# Altium footprint library Capacitor.PcbLib: 119 footprints (part 8 of 8)
Each footprint in its own frame and in the unit in brackets; x right, y up, seen from the top. Pads: shape width x height; smd on the part's side, far side on the other; paste and mask are expansions set on the pad; w line width, h text height; cw(c..) or ccw(c..) is an arc to the next point about the centre after c.
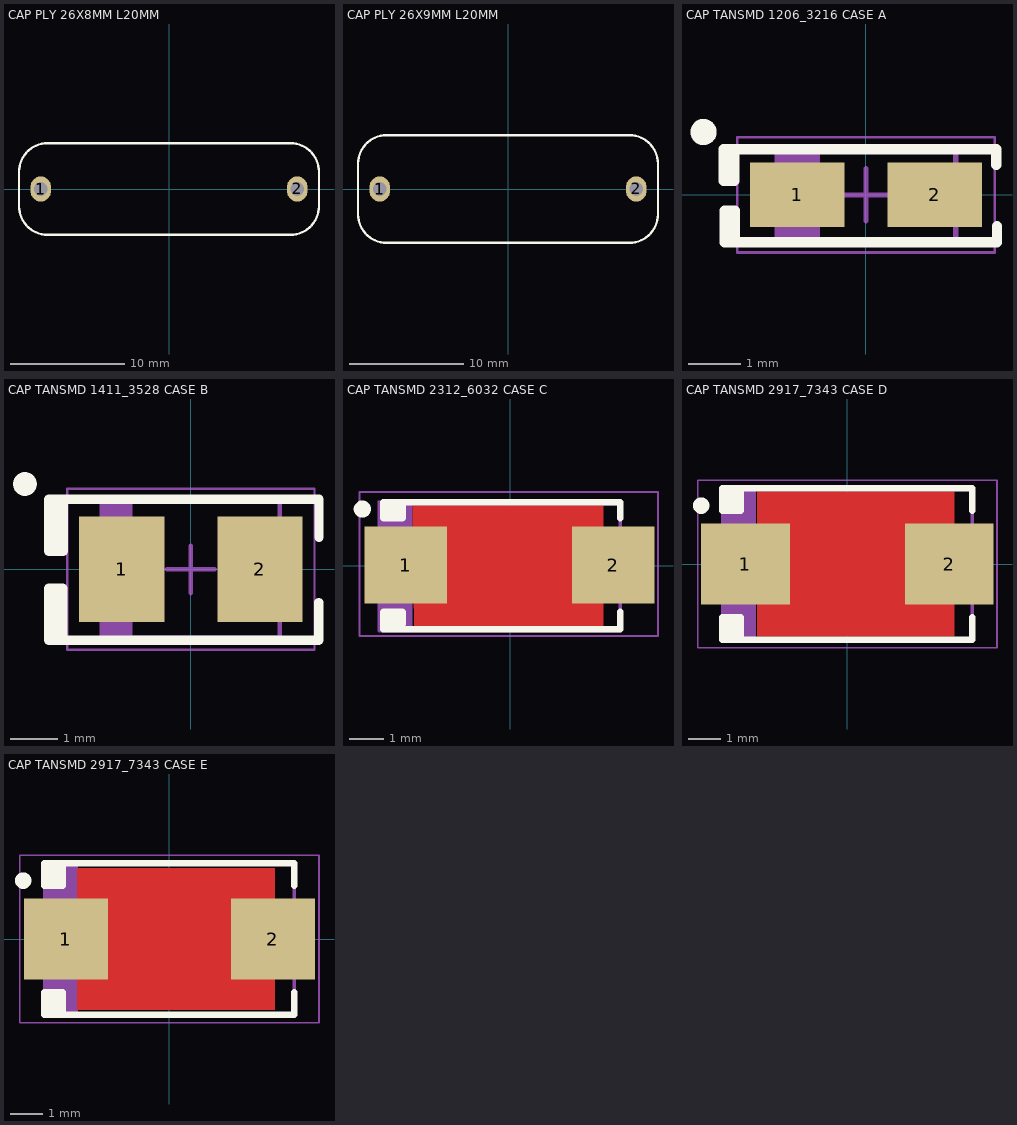
[diagram p7: the footprints below, top view; thin cyan lines are the x and y axes]

## CAP PLY 26X8MM L20MM [mm] "CAP, POLYESTER, 26.0X7.8mm pitch: 20.0mm, 0.68uF 400V"
pads (2):
  oval 1.8x2.2 hole 1.2: 1(-11.2,0) 2(11.2,0)
Top Overlay:
  lines w0.2: -13.1,-1.5 ccw(c-10.6,-1.5) -10.6,-4 10.6,-4 ccw(c10.6,-1.5) 13.1,-1.5 13.1,1.5 ccw(c10.6,1.5) 10.6,4 -10.6,4 ccw(c-10.6,1.5) -13.1,1.5 -13.1,-1.5
3D body "User Library-ECQE(F) 0_33uf 630Vdc 250Vac.step": height 19, standoff -3, extent -13,-3.9 13,3.9

## CAP PLY 26X9MM L20MM [mm] "CAP, POLYESTER, 26.0X9.3mm pitch: 20.0mm, 0.68uF 400V"
pads (2):
  oval 1.8x2.2 hole 1.2: 1(-11.2,0) 2(11.2,0)
Top Overlay:
  lines w0.2: -13.1,-2.2 ccw(c-10.6,-2.2) -10.6,-4.7 10.6,-4.7 ccw(c10.6,-2.2) 13.1,-2.2 13.1,2.2 ccw(c10.6,2.2) 10.6,4.7 -10.6,4.7 ccw(c-10.6,2.2) -13.1,2.2 -13.1,-2.2
3D body "SW3dPS-ECQE(F) 0.47uf 630Vdc 250Vac.STEP": height 3, standoff -20.5, extent -13,-4.65 13,4.65

## CAP TANSMD 1206_3216 CASE A [mm] "Molded Capacitor, 2-Leads, Body 3.20x1.6mm, Case A, IPC Medium Density"
height 1.7
pads (2):
  rect 1.8x1.23 smd: 1(-1.31,0) 2(1.31,0)
Top Overlay:
  circle w0.25: c-3.1,1.2 r0.125
  rectangle: -2.717,0.273 -2.567,0.873
  rectangle: -2.7,-0.9 -2.55,-0.3
  lines w0.2: -2.517,0.873 -2.517,0.273 -2.717,0.273 -2.717,0.873 2.483,0.873 2.483,0.573 ; -2.5,-0.9 -2.5,-0.3 -2.7,-0.3 -2.7,-0.9 2.5,-0.9 2.5,-0.6
Mechanical 13:
  rectangle: -1.715,-0.85 -0.875,0.85
  lines w0.1: -1.7,-0.85 -1.7,0.85 1.715,0.85 1.715,-0.85 -1.7,-0.85
Mechanical 15:
  lines w0.05: -2.46,-1.1 2.46,-1.1 2.46,1.1 -2.46,1.1 -2.46,-1.1
  lines w0.1: -0.5,0 0.5,0 ; 0,-0.5 0,0.5
3D body "CAP TANT - 1206 - 1.7MM.step": height 1.7, standoff 0, extent -1.715,-0.85 1.715,0.85

## CAP TANSMD 1411_3528 CASE B [mm] "Molded Capacitor, 2-Leads, Body 3.50x2.80mm, Case B, IPC Medium Density"
height 2
pads (2):
  rect 1.8x2.23 smd: 1(-1.46,0) 2(1.46,0)
Top Overlay:
  circle w0.25: c-3.5,1.8 r0.125
  region: -2.995,0.38 -2.995,1.48 -2.695,1.48 -2.695,0.38
  region: -3,-0.4 -3,-1.5 -2.7,-1.5 -2.7,-0.4
  lines w0.2: 2.7,-0.7 2.7,-1.5 -2.7,-1.5 ; 2.705,0.68 2.705,1.48 -2.695,1.48 ; -2.7,-1.5 -3,-1.5 -3,-0.4 -2.7,-0.4 -2.7,-1.5 ; -2.695,1.48 -2.995,1.48 -2.995,0.38 -2.695,0.38 -2.695,1.48
Mechanical 13:
  rectangle: -1.875,-1.45 -1.225,1.45
  lines w0.1: -1.875,-1.45 -1.875,1.45 1.875,1.45 1.875,-1.45 -1.875,-1.45
Mechanical 15:
  lines w0.05: -2.61,-1.7 -2.61,1.7 2.61,1.7 2.61,-1.7 -2.61,-1.7
  lines w0.1: -0.5,0 0.5,0 ; 0,-0.5 0,0.5
3D body "CAP TANT - 1411 - 2.0MM.step": height 2, standoff 0, extent -1.865,-1.45 1.865,1.45

## CAP TANSMD 2312_6032 CASE C [mm] "Molded Capacitor, 2-Leads, Body 6x3.2mm, Case C, IPC Medium Density"
height 2.5
pads (2):
  rect 2.4x2.25 smd: 1(-3.05,0.018) 2(3,0.018)
Top Layer:
  pour cut-out: -2.85,1.75 2.7,1.75 2.7,-1.85 -2.8,-1.85
Top Overlay:
  circle w0.25: c-4.318,1.651 r0.125
  rectangle: -3.698,1.389 -3.148,1.9
  rectangle: -3.698,-1.95 -3.148,-1.353
  lines w0.2: -3.148,-1.7 -3.148,-1.353 -3.698,-1.353 -3.698,-1.85 3.2,-1.85 3.2,-1.353 ; -3.148,1.8 -3.148,1.389 -3.698,1.389 -3.698,1.85 3.2,1.85 3.2,1.389
Mechanical 13:
  rectangle: -3.872,-1.85 -2.85,1.9
  lines w0.1: -3.825,1.8 3.2,1.8 3.2,-1.9 -3.825,-1.9 -3.825,1.85
Mechanical 15:
  lines w0.05: -4.4,-2.05 4.3,-2.05 4.3,2.15 -4.4,2.15 -4.4,-2.05
  lines w0.1: -0.525,0.018 0.475,0.018 ; -0.025,-0.482 -0.025,0.518
3D body "User Library-CAP_TANT_6032-28_y.step": height 2.8, standoff 0, extent -3.15,-1.75 3.15,1.75

## CAP TANSMD 2917_7343 CASE D [mm] "Molded Capacitor, 2-Leads, Body 7.30x4.30mm, Case D, IPC Medium Density"
height 2.8
pads (2):
  rect 2.7x2.45 smd: 1(-3.1,0) 2(3.1,0)
Top Layer:
  pour cut-out: -2.75,2.2 3.25,2.2 3.25,-2.2 -2.75,-2.2
Top Overlay:
  circle w0.25: c-4.45,1.775 r0.125
  rectangle: -3.8,1.625 -3.25,2.3
  rectangle: -3.8,-2.3 -3.25,-1.625
  lines w0.2: -3.25,-2.3 -3.25,-1.625 -3.8,-1.625 -3.8,-2.3 3.8,-2.3 3.8,-1.625 ; -3.25,2.3 -3.25,1.625 -3.8,1.625 -3.8,2.3 3.8,2.3 3.8,1.625
Mechanical 13:
  rectangle: -3.8,-2.3 -2.778,2.3
  lines w0.1: -3.8,-2.3 3.8,-2.3 3.8,2.3 -3.8,2.3 -3.8,-2.3
Mechanical 15:
  lines w0.05: -4.55,-2.55 4.55,-2.55 4.55,2.55 -4.55,2.55 -4.55,-2.55
  lines w0.1: -0.5,0 0.5,0 ; 0,-0.5 0,0.5
3D body "t491d226k035at.stp": height 3.21, standoff 0.11, extent -3.85,-2.35 3.75,2.25

## CAP TANSMD 2917_7343 CASE E [mm] "Molded Capacitor, 2-Leads, Body 7.30x4.30mm, Case E, IPC Medium Density"
height 4
pads (2):
  rect 2.55x2.45 smd: 1(-3.15,0) 2(3.15,0)
Top Layer:
  pour cut-out: -2.8,2.15 3.2,2.15 3.2,-2.15 -2.8,-2.15
Top Overlay:
  circle w0.25: c-4.45,1.775 r0.125
  rectangle: -3.8,-2.3 -3.25,-1.625
  rectangle: -3.8,1.625 -3.25,2.3
  lines w0.2: -3.25,-2.3 -3.25,-1.625 -3.8,-1.625 -3.8,-2.3 3.8,-2.3 3.8,-1.625 ; -3.25,2.3 -3.25,1.625 -3.8,1.625 -3.8,2.3 3.8,2.3 3.8,1.625
Mechanical 13:
  rectangle: -3.8,-2.3 -2.778,2.3
  lines w0.1: -3.8,-2.3 -3.8,2.3 3.8,2.3 3.8,-2.3 -3.8,-2.3
Mechanical 15:
  lines w0.05: -4.55,-2.55 -4.55,2.55 4.55,2.55 4.55,-2.55 -4.55,-2.55
  lines w0.1: -0.5,0 0.5,0 ; 0,-0.5 0,0.5
3D body "Tantalum Capacitor case E.STEP": height 4.1, standoff 0, extent -3.65,-2.15 3.65,2.15